# Altium footprint library SAMTEC THD.PcbLib: 161 footprints (part 3 of 12) (continued)
## SAMTEC_MTLW-107-07-L-D-250 [mm] "14 Contacts - Pitch 2.54mm - Dual Row Through Mount Straight Header (Post Lead = 6.35mm, Tail Lead 3.05mm, Insulator 1.52mm)"
height 7.87
pads (14):
  round 1.7 hole 1: 1(-7.62,-1.27) 2(-7.62,1.27) 3(-5.08,-1.27) 4(-5.08,1.27) 5(-2.54,-1.27) 6(-2.54,1.27) 7(0,-1.27) 8(0,1.27) 9(2.54,-1.27) 10(2.54,1.27) 11(5.08,-1.27) 12(5.08,1.27) 13(7.62,-1.27) 14(7.62,1.27)
Top Overlay:
  circle w0.3: c-7.585,-3.135 r0.15
  lines w0.2: 8.89,-2.007 8.636,-2.515 6.604,-2.515 6.35,-2.007 6.096,-2.515 4.064,-2.515 3.81,-2.007 3.556,-2.515 1.524,-2.515 1.27,-2.007 1.016,-2.515 -1.016,-2.515 -1.27,-2.007 -1.524,-2.515 -3.556,-2.515 -3.81,-2.007 -4.064,-2.515 -6.096,-2.515 -6.35,-2.007 -6.604,-2.515 -8.636,-2.515 -8.89,-2.007 -8.89,2.007 -8.636,2.515 -6.604,2.515 -6.35,2.007 -6.096,2.515 -4.064,2.515 -3.81,2.007 -3.556,2.515 -1.524,2.515 -1.27,2.007 -1.016,2.515 1.016,2.515 1.27,2.007 1.524,2.515 3.556,2.515 3.81,2.007 4.064,2.515 6.096,2.515 6.35,2.007 6.604,2.515 8.636,2.515 8.89,2.007 ; 8.89,-2.007 8.89,2.007 ; 8.89,-2.007 8.89,2.007
  text "1" at -9.867,-1.768 h1
Mechanical 8:
  lines w0.1: -8.12,-1.27 -7.62,-1.27 ; -8.12,1.27 -7.62,1.27 ; -7.62,-1.77 -7.62,-1.27 ; -7.62,-0.77 -7.62,-1.27 ; -7.62,0.77 -7.62,1.27 ; -7.62,1.77 -7.62,1.27 ; -7.12,-1.27 -7.62,-1.27 ; -7.12,1.27 -7.62,1.27 ; -5.58,-1.27 -5.08,-1.27 ; -5.58,1.27 -5.08,1.27 ; -5.08,-1.77 -5.08,-1.27 ; -5.08,-0.77 -5.08,-1.27 ; -5.08,0.77 -5.08,1.27 ; -5.08,1.77 -5.08,1.27 ; -4.58,-1.27 -5.08,-1.27 ; -4.58,1.27 -5.08,1.27 ; -3.04,-1.27 -2.54,-1.27 ; -3.04,1.27 -2.54,1.27 ; -2.54,-1.77 -2.54,-1.27 ; -2.54,-0.77 -2.54,-1.27 ; -2.54,0.77 -2.54,1.27 ; -2.54,1.77 -2.54,1.27 ; -2.04,-1.27 -2.54,-1.27 ; -2.04,1.27 -2.54,1.27 ; -0.5,-1.27 0,-1.27 ; -0.5,0 0,0 ; -0.5,1.27 0,1.27 ; 0,-1.77 0,-1.27 ; 0,-0.77 0,-1.27 ; 0,-0.5 0,0 ; 0,0.5 0,0 ; 0,0.77 0,1.27 ; 0,1.77 0,1.27 ; 0.5,-1.27 0,-1.27 ; 0.5,0 0,0 ; 0.5,1.27 0,1.27 ; 2.04,-1.27 2.54,-1.27 ; 2.04,1.27 2.54,1.27 ; 2.54,-1.77 2.54,-1.27 ; 2.54,-0.77 2.54,-1.27 ; 2.54,0.77 2.54,1.27 ; 2.54,1.77 2.54,1.27 ; 3.04,-1.27 2.54,-1.27 ; 3.04,1.27 2.54,1.27 ; 4.58,-1.27 5.08,-1.27 ; 4.58,1.27 5.08,1.27 ; 5.08,-1.77 5.08,-1.27 ; 5.08,-0.77 5.08,-1.27 ; 5.08,0.77 5.08,1.27 ; 5.08,1.77 5.08,1.27 ; 5.58,-1.27 5.08,-1.27 ; 5.58,1.27 5.08,1.27 ; 7.12,-1.27 7.62,-1.27 ; 7.12,1.27 7.62,1.27 ; 7.62,-1.77 7.62,-1.27 ; 7.62,-0.77 7.62,-1.27 ; 7.62,0.77 7.62,1.27 ; 7.62,1.77 7.62,1.27 ; 8.12,-1.27 7.62,-1.27 ; 8.12,1.27 7.62,1.27
Mechanical 14:
  circle w0.3: c-7.585,-3.135 r0.15
  lines w0.1: 8.89,-2.007 8.636,-2.515 6.604,-2.515 6.35,-2.007 6.096,-2.515 4.064,-2.515 3.81,-2.007 3.556,-2.515 1.524,-2.515 1.27,-2.007 1.016,-2.515 -1.016,-2.515 -1.27,-2.007 -1.524,-2.515 -3.556,-2.515 -3.81,-2.007 -4.064,-2.515 -6.096,-2.515 -6.35,-2.007 -6.604,-2.515 -8.636,-2.515 -8.89,-2.007 -8.89,2.007 -8.636,2.515 -6.604,2.515 -6.35,2.007 -6.096,2.515 -4.064,2.515 -3.81,2.007 -3.556,2.515 -1.524,2.515 -1.27,2.007 -1.016,2.515 1.016,2.515 1.27,2.007 1.524,2.515 3.556,2.515 3.81,2.007 4.064,2.515 6.096,2.515 6.35,2.007 6.604,2.515 8.636,2.515 8.89,2.007 ; -7.937,-1.587 -7.937,-0.953 -7.302,-0.953 -7.302,-1.587 -7.937,-1.587 ; -7.937,0.953 -7.937,1.587 -7.302,1.587 -7.302,0.953 -7.937,0.953 ; -5.397,-1.587 -5.397,-0.953 -4.762,-0.953 -4.762,-1.587 -5.397,-1.587 ; -5.397,0.953 -5.397,1.587 -4.762,1.587 -4.762,0.953 -5.397,0.953 ; -2.857,-1.587 -2.857,-0.953 -2.222,-0.953 -2.222,-1.587 -2.857,-1.587 ; -2.857,0.953 -2.857,1.587 -2.222,1.587 -2.222,0.953 -2.857,0.953 ; -0.317,-1.587 -0.317,-0.953 0.318,-0.953 0.318,-1.587 -0.317,-1.587 ; -0.317,0.953 -0.317,1.587 0.318,1.587 0.318,0.953 -0.317,0.953 ; 2.223,-1.587 2.223,-0.953 2.858,-0.953 2.858,-1.587 2.223,-1.587 ; 2.223,0.953 2.223,1.587 2.858,1.587 2.858,0.953 2.223,0.953 ; 4.763,-1.587 4.763,-0.953 5.398,-0.953 5.398,-1.587 4.763,-1.587 ; 4.763,0.953 4.763,1.587 5.398,1.587 5.398,0.953 4.763,0.953 ; 7.303,-1.587 7.303,-0.953 7.938,-0.953 7.938,-1.587 7.303,-1.587 ; 7.303,0.953 7.303,1.587 7.938,1.587 7.938,0.953 7.303,0.953
  text "1" at -9.867,-1.768 h1
3D body "SAMTEC_MTLW-107-07-L-D-250.stp": height 7.87, standoff -3.05, extent -8.89,-2.514 8.89,2.515

## SAMTEC_MTLW-108-07-L-D-250 [mm] "16 Contacts - Pitch 2.54mm - Dual Row Through Mount Straight Header (Post Lead = 6.35mm, Tail Lead 3.05mm, Insulator 1.52mm)"
height 7.87
pads (16):
  round 1.7 hole 1: 1(-8.89,-1.27) 2(-8.89,1.27) 3(-6.35,-1.27) 4(-6.35,1.27) 5(-3.81,-1.27) 6(-3.81,1.27) 7(-1.27,-1.27) 8(-1.27,1.27) 9(1.27,-1.27) 10(1.27,1.27) 11(3.81,-1.27) 12(3.81,1.27) 13(6.35,-1.27) 14(6.35,1.27) 15(8.89,-1.27) 16(8.89,1.27)
Top Overlay:
  circle w0.3: c-8.855,-3.135 r0.15
  lines w0.2: -10.16,-2.007 -9.906,-2.515 -7.874,-2.515 -7.62,-2.007 -7.366,-2.515 -5.334,-2.515 -5.08,-2.007 -4.826,-2.515 -2.794,-2.515 -2.54,-2.007 -2.286,-2.515 -0.254,-2.515 0,-2.007 0.254,-2.515 2.286,-2.515 2.54,-2.007 2.794,-2.515 4.826,-2.515 5.08,-2.007 5.334,-2.515 7.366,-2.515 7.62,-2.007 7.874,-2.515 9.906,-2.515 10.16,-2.007 10.16,2.007 9.906,2.515 7.874,2.515 7.62,2.007 7.366,2.515 5.334,2.515 5.08,2.007 4.826,2.515 2.794,2.515 2.54,2.007 2.286,2.515 0.254,2.515 0,2.007 -0.254,2.515 -2.286,2.515 -2.54,2.007 -2.794,2.515 -4.826,2.515 -5.08,2.007 -5.334,2.515 -7.366,2.515 -7.62,2.007 -7.874,2.515 -9.906,2.515 -10.16,2.007 -10.16,-2.007
  text "1" at -11.137,-1.768 h1
Mechanical 8:
  lines w0.1: -9.39,-1.27 -8.89,-1.27 ; -9.39,1.27 -8.89,1.27 ; -8.89,-1.77 -8.89,-1.27 ; -8.89,-0.77 -8.89,-1.27 ; -8.89,0.77 -8.89,1.27 ; -8.89,1.77 -8.89,1.27 ; -8.39,-1.27 -8.89,-1.27 ; -8.39,1.27 -8.89,1.27 ; -6.85,-1.27 -6.35,-1.27 ; -6.85,1.27 -6.35,1.27 ; -6.35,-1.77 -6.35,-1.27 ; -6.35,-0.77 -6.35,-1.27 ; -6.35,0.77 -6.35,1.27 ; -6.35,1.77 -6.35,1.27 ; -5.85,-1.27 -6.35,-1.27 ; -5.85,1.27 -6.35,1.27 ; -4.31,-1.27 -3.81,-1.27 ; -4.31,1.27 -3.81,1.27 ; -3.81,-1.77 -3.81,-1.27 ; -3.81,-0.77 -3.81,-1.27 ; -3.81,0.77 -3.81,1.27 ; -3.81,1.77 -3.81,1.27 ; -3.31,-1.27 -3.81,-1.27 ; -3.31,1.27 -3.81,1.27 ; -1.77,-1.27 -1.27,-1.27 ; -1.77,1.27 -1.27,1.27 ; -1.27,-1.77 -1.27,-1.27 ; -1.27,-0.77 -1.27,-1.27 ; -1.27,0.77 -1.27,1.27 ; -1.27,1.77 -1.27,1.27 ; -0.77,-1.27 -1.27,-1.27 ; -0.77,1.27 -1.27,1.27 ; -0.5,0 0,0 ; 0,-0.5 0,0 ; 0,0.5 0,0 ; 0.5,0 0,0 ; 0.77,-1.27 1.27,-1.27 ; 0.77,1.27 1.27,1.27 ; 1.27,-1.77 1.27,-1.27 ; 1.27,-0.77 1.27,-1.27 ; 1.27,0.77 1.27,1.27 ; 1.27,1.77 1.27,1.27 ; 1.77,-1.27 1.27,-1.27 ; 1.77,1.27 1.27,1.27 ; 3.31,-1.27 3.81,-1.27 ; 3.31,1.27 3.81,1.27 ; 3.81,-1.77 3.81,-1.27 ; 3.81,-0.77 3.81,-1.27 ; 3.81,0.77 3.81,1.27 ; 3.81,1.77 3.81,1.27 ; 4.31,-1.27 3.81,-1.27 ; 4.31,1.27 3.81,1.27 ; 5.85,-1.27 6.35,-1.27 ; 5.85,1.27 6.35,1.27 ; 6.35,-1.77 6.35,-1.27 ; 6.35,-0.77 6.35,-1.27 ; 6.35,0.77 6.35,1.27 ; 6.35,1.77 6.35,1.27 ; 6.85,-1.27 6.35,-1.27 ; 6.85,1.27 6.35,1.27 ; 8.39,-1.27 8.89,-1.27 ; 8.39,1.27 8.89,1.27 ; 8.89,-1.77 8.89,-1.27 ; 8.89,-0.77 8.89,-1.27 ; 8.89,0.77 8.89,1.27 ; 8.89,1.77 8.89,1.27 ; 9.39,-1.27 8.89,-1.27 ; 9.39,1.27 8.89,1.27
Mechanical 14:
  circle w0.3: c-8.855,-3.135 r0.15
  lines w0.1: -10.16,-2.007 -9.906,-2.515 -7.874,-2.515 -7.62,-2.007 -7.366,-2.515 -5.334,-2.515 -5.08,-2.007 -4.826,-2.515 -2.794,-2.515 -2.54,-2.007 -2.286,-2.515 -0.254,-2.515 0,-2.007 0.254,-2.515 2.286,-2.515 2.54,-2.007 2.794,-2.515 4.826,-2.515 5.08,-2.007 5.334,-2.515 7.366,-2.515 7.62,-2.007 7.874,-2.515 9.906,-2.515 10.16,-2.007 10.16,2.007 9.906,2.515 7.874,2.515 7.62,2.007 7.366,2.515 5.334,2.515 5.08,2.007 4.826,2.515 2.794,2.515 2.54,2.007 2.286,2.515 0.254,2.515 0,2.007 -0.254,2.515 -2.286,2.515 -2.54,2.007 -2.794,2.515 -4.826,2.515 -5.08,2.007 -5.334,2.515 -7.366,2.515 -7.62,2.007 -7.874,2.515 -9.906,2.515 -10.16,2.007 -10.16,-2.007 ; -9.207,-1.587 -8.572,-1.587 -8.572,-0.953 -9.207,-0.953 -9.207,-1.587 ; -9.207,0.953 -8.572,0.953 -8.572,1.587 -9.207,1.587 -9.207,0.953 ; -6.667,-1.587 -6.032,-1.587 -6.032,-0.953 -6.667,-0.953 -6.667,-1.587 ; -6.667,0.953 -6.032,0.953 -6.032,1.587 -6.667,1.587 -6.667,0.953 ; -4.127,-1.587 -3.492,-1.587 -3.492,-0.953 -4.127,-0.953 -4.127,-1.587 ; -4.127,0.953 -3.492,0.953 -3.492,1.587 -4.127,1.587 -4.127,0.953 ; -1.587,-1.587 -0.952,-1.587 -0.952,-0.953 -1.587,-0.953 -1.587,-1.587 ; -1.587,0.953 -0.952,0.953 -0.952,1.587 -1.587,1.587 -1.587,0.953 ; 0.953,-1.587 1.588,-1.587 1.588,-0.953 0.953,-0.953 0.953,-1.587 ; 0.953,0.953 1.588,0.953 1.588,1.587 0.953,1.587 0.953,0.953 ; 3.493,-1.587 4.128,-1.587 4.128,-0.953 3.493,-0.953 3.493,-1.587 ; 3.493,0.953 4.128,0.953 4.128,1.587 3.493,1.587 3.493,0.953 ; 6.033,-1.587 6.668,-1.587 6.668,-0.953 6.033,-0.953 6.033,-1.587 ; 6.033,0.953 6.668,0.953 6.668,1.587 6.033,1.587 6.033,0.953 ; 8.573,-1.587 9.208,-1.587 9.208,-0.953 8.573,-0.953 8.573,-1.587 ; 8.573,0.953 9.208,0.953 9.208,1.587 8.573,1.587 8.573,0.953
  text "1" at -11.137,-1.768 h1
3D body "SAMTEC_MTLW-108-07-L-D-250.stp": height 7.87, standoff -3.05, extent -10.16,-2.514 10.16,2.515

## SAMTEC_MTLW-110-07-L-D-250 [mm] "20 Contacts - Pitch 2.54mm - Dual Row Through Mount Straight Header (Post Lead = 6.35mm, Tail Lead 3.05mm, Insulator 1.52mm)"
height 7.87
pads (20):
  round 1.7 hole 1: 1(-11.43,-1.27) 2(-11.43,1.27) 3(-8.89,-1.27) 4(-8.89,1.27) 5(-6.35,-1.27) 6(-6.35,1.27) 7(-3.81,-1.27) 8(-3.81,1.27) 9(-1.27,-1.27) 10(-1.27,1.27) 11(1.27,-1.27) 12(1.27,1.27) 13(3.81,-1.27) 14(3.81,1.27) 15(6.35,-1.27) 16(6.35,1.27) 17(8.89,-1.27) 18(8.89,1.27) 19(11.43,-1.27) 20(11.43,1.27)
Top Overlay:
  circle w0.3: c-11.395,-3.135 r0.15
  lines w0.2: -12.7,-2.007 -12.7,2.007 -12.446,2.515 -10.414,2.515 -10.16,2.007 -9.906,2.515 -7.874,2.515 -7.62,2.007 -7.366,2.515 -5.334,2.515 -5.08,2.007 -4.826,2.515 -2.794,2.515 -2.54,2.007 -2.286,2.515 -0.254,2.515 0,2.007 0.254,2.515 2.286,2.515 2.54,2.007 2.794,2.515 4.826,2.515 5.08,2.007 5.334,2.515 7.366,2.515 7.62,2.007 7.874,2.515 9.906,2.515 10.16,2.007 10.414,2.515 12.446,2.515 12.7,2.007 12.7,-2.007 12.446,-2.515 10.414,-2.515 10.16,-2.007 9.906,-2.515 7.874,-2.515 7.62,-2.007 7.366,-2.515 5.334,-2.515 5.08,-2.007 4.826,-2.515 2.794,-2.515 2.54,-2.007 2.286,-2.515 0.254,-2.515 0,-2.007 -0.254,-2.515 -2.286,-2.515 -2.54,-2.007 -2.794,-2.515 -4.826,-2.515 -5.08,-2.007 -5.334,-2.515 -7.366,-2.515 -7.62,-2.007 -7.874,-2.515 -9.906,-2.515 -10.16,-2.007 -10.414,-2.515 -12.446,-2.515 -12.7,-2.007
  text "1" at -13.677,-1.768 h1
Mechanical 8:
  lines w0.1: -11.93,-1.27 -11.43,-1.27 ; -11.93,1.27 -11.43,1.27 ; -11.43,-1.77 -11.43,-1.27 ; -11.43,-0.77 -11.43,-1.27 ; -11.43,0.77 -11.43,1.27 ; -11.43,1.77 -11.43,1.27 ; -10.93,-1.27 -11.43,-1.27 ; -10.93,1.27 -11.43,1.27 ; -9.39,-1.27 -8.89,-1.27 ; -9.39,1.27 -8.89,1.27 ; -8.89,-1.77 -8.89,-1.27 ; -8.89,-0.77 -8.89,-1.27 ; -8.89,0.77 -8.89,1.27 ; -8.89,1.77 -8.89,1.27 ; -8.39,-1.27 -8.89,-1.27 ; -8.39,1.27 -8.89,1.27 ; -6.85,-1.27 -6.35,-1.27 ; -6.85,1.27 -6.35,1.27 ; -6.35,-1.77 -6.35,-1.27 ; -6.35,-0.77 -6.35,-1.27 ; -6.35,0.77 -6.35,1.27 ; -6.35,1.77 -6.35,1.27 ; -5.85,-1.27 -6.35,-1.27 ; -5.85,1.27 -6.35,1.27 ; -4.31,-1.27 -3.81,-1.27 ; -4.31,1.27 -3.81,1.27 ; -3.81,-1.77 -3.81,-1.27 ; -3.81,-0.77 -3.81,-1.27 ; -3.81,0.77 -3.81,1.27 ; -3.81,1.77 -3.81,1.27 ; -3.31,-1.27 -3.81,-1.27 ; -3.31,1.27 -3.81,1.27 ; -1.77,-1.27 -1.27,-1.27 ; -1.77,1.27 -1.27,1.27 ; -1.27,-1.77 -1.27,-1.27 ; -1.27,-0.77 -1.27,-1.27 ; -1.27,0.77 -1.27,1.27 ; -1.27,1.77 -1.27,1.27 ; -0.77,-1.27 -1.27,-1.27 ; -0.77,1.27 -1.27,1.27 ; -0.5,0 0,0 ; 0,-0.5 0,0 ; 0,0.5 0,0 ; 0.5,0 0,0 ; 0.77,-1.27 1.27,-1.27 ; 0.77,1.27 1.27,1.27 ; 1.27,-1.77 1.27,-1.27 ; 1.27,-0.77 1.27,-1.27 ; 1.27,0.77 1.27,1.27 ; 1.27,1.77 1.27,1.27 ; 1.77,-1.27 1.27,-1.27 ; 1.77,1.27 1.27,1.27 ; 3.31,-1.27 3.81,-1.27 ; 3.31,1.27 3.81,1.27 ; 3.81,-1.77 3.81,-1.27 ; 3.81,-0.77 3.81,-1.27 ; 3.81,0.77 3.81,1.27 ; 3.81,1.77 3.81,1.27 ; 4.31,-1.27 3.81,-1.27 ; 4.31,1.27 3.81,1.27 ; 5.85,-1.27 6.35,-1.27 ; 5.85,1.27 6.35,1.27 ; 6.35,-1.77 6.35,-1.27 ; 6.35,-0.77 6.35,-1.27 ; 6.35,0.77 6.35,1.27 ; 6.35,1.77 6.35,1.27 ; 6.85,-1.27 6.35,-1.27 ; 6.85,1.27 6.35,1.27 ; 8.39,-1.27 8.89,-1.27 ; 8.39,1.27 8.89,1.27 ; 8.89,-1.77 8.89,-1.27 ; 8.89,-0.77 8.89,-1.27 ; 8.89,0.77 8.89,1.27 ; 8.89,1.77 8.89,1.27 ; 9.39,-1.27 8.89,-1.27 ; 9.39,1.27 8.89,1.27 ; 10.93,-1.27 11.43,-1.27 ; 10.93,1.27 11.43,1.27 ; 11.43,-1.77 11.43,-1.27 ; 11.43,-0.77 11.43,-1.27 ; 11.43,0.77 11.43,1.27 ; 11.43,1.77 11.43,1.27 ; 11.93,-1.27 11.43,-1.27 ; 11.93,1.27 11.43,1.27
Mechanical 14:
  circle w0.3: c-11.395,-3.135 r0.15
  lines w0.1: -12.7,-2.007 -12.7,2.007 -12.446,2.515 -10.414,2.515 -10.16,2.007 -9.906,2.515 -7.874,2.515 -7.62,2.007 -7.366,2.515 -5.334,2.515 -5.08,2.007 -4.826,2.515 -2.794,2.515 -2.54,2.007 -2.286,2.515 -0.254,2.515 0,2.007 0.254,2.515 2.286,2.515 2.54,2.007 2.794,2.515 4.826,2.515 5.08,2.007 5.334,2.515 7.366,2.515 7.62,2.007 7.874,2.515 9.906,2.515 10.16,2.007 10.414,2.515 12.446,2.515 12.7,2.007 12.7,-2.007 12.446,-2.515 10.414,-2.515 10.16,-2.007 9.906,-2.515 7.874,-2.515 7.62,-2.007 7.366,-2.515 5.334,-2.515 5.08,-2.007 4.826,-2.515 2.794,-2.515 2.54,-2.007 2.286,-2.515 0.254,-2.515 0,-2.007 -0.254,-2.515 -2.286,-2.515 -2.54,-2.007 -2.794,-2.515 -4.826,-2.515 -5.08,-2.007 -5.334,-2.515 -7.366,-2.515 -7.62,-2.007 -7.874,-2.515 -9.906,-2.515 -10.16,-2.007 -10.414,-2.515 -12.446,-2.515 -12.7,-2.007 ; -11.748,-1.587 -11.748,-0.953 -11.113,-0.953 -11.113,-1.587 -11.748,-1.587 ; -11.748,0.953 -11.748,1.587 -11.113,1.587 -11.113,0.953 -11.748,0.953 ; -9.208,-1.587 -9.208,-0.953 -8.573,-0.953 -8.573,-1.587 -9.208,-1.587 ; -9.208,0.953 -9.208,1.587 -8.573,1.587 -8.573,0.953 -9.208,0.953 ; -6.668,-1.587 -6.668,-0.953 -6.033,-0.953 -6.033,-1.587 -6.668,-1.587 ; -6.668,0.953 -6.668,1.587 -6.033,1.587 -6.033,0.953 -6.668,0.953 ; -4.128,-1.587 -4.128,-0.953 -3.493,-0.953 -3.493,-1.587 -4.128,-1.587 ; -4.128,0.953 -4.128,1.587 -3.493,1.587 -3.493,0.953 -4.128,0.953 ; -1.587,-1.587 -1.587,-0.953 -0.953,-0.953 -0.953,-1.587 -1.587,-1.587 ; -1.587,0.953 -1.587,1.587 -0.953,1.587 -0.953,0.953 -1.587,0.953 ; 0.953,-1.587 0.953,-0.953 1.587,-0.953 1.587,-1.587 0.953,-1.587 ; 0.953,0.953 0.953,1.587 1.587,1.587 1.587,0.953 0.953,0.953 ; 3.493,-1.587 3.493,-0.953 4.128,-0.953 4.128,-1.587 3.493,-1.587 ; 3.493,0.953 3.493,1.587 4.128,1.587 4.128,0.953 3.493,0.953 ; 6.033,-1.587 6.033,-0.953 6.668,-0.953 6.668,-1.587 6.033,-1.587 ; 6.033,0.953 6.033,1.587 6.668,1.587 6.668,0.953 6.033,0.953 ; 8.573,-1.587 8.573,-0.953 9.208,-0.953 9.208,-1.587 8.573,-1.587 ; 8.573,0.953 8.573,1.587 9.208,1.587 9.208,0.953 8.573,0.953 ; 11.113,-1.587 11.113,-0.953 11.748,-0.953 11.748,-1.587 11.113,-1.587 ; 11.113,0.953 11.113,1.587 11.748,1.587 11.748,0.953 11.113,0.953
  text "1" at -13.677,-1.768 h1
3D body "SAMTEC_MTLW-110-07-L-D-250.stp": height 7.87, standoff -3.05, extent -12.7,-2.514 12.7,2.515

## SAMTEC_MTLW-111-07-L-D-250 [mm] "22 Contacts - Pitch 2.54mm - Dual Row Through Mount Straight Header (Post Lead = 6.35mm, Tail Lead 3.05mm, Insulator 1.52mm)"
height 7.87
pads (22):
  round 1.7 hole 1: 1(-12.7,-1.27) 2(-12.7,1.27) 3(-10.16,-1.27) 4(-10.16,1.27) 5(-7.62,-1.27) 6(-7.62,1.27) 7(-5.08,-1.27) 8(-5.08,1.27) 9(-2.54,-1.27) 10(-2.54,1.27) 11(0,-1.27) 12(0,1.27) 13(2.54,-1.27) 14(2.54,1.27) 15(5.08,-1.27) 16(5.08,1.27) 17(7.62,-1.27) 18(7.62,1.27) 19(10.16,-1.27) 20(10.16,1.27) 21(12.7,-1.27) 22(12.7,1.27)
Top Overlay:
  circle w0.3: c-12.665,-3.135 r0.15
  lines w0.2: -13.97,-2.007 -13.716,-2.515 -11.684,-2.515 -11.43,-2.007 -11.176,-2.515 -9.144,-2.515 -8.89,-2.007 -8.636,-2.515 -6.604,-2.515 -6.35,-2.007 -6.096,-2.515 -4.064,-2.515 -3.81,-2.007 -3.556,-2.515 -1.524,-2.515 -1.27,-2.007 -1.016,-2.515 1.016,-2.515 1.27,-2.007 1.524,-2.515 3.556,-2.515 3.81,-2.007 4.064,-2.515 6.096,-2.515 6.35,-2.007 6.604,-2.515 8.636,-2.515 8.89,-2.007 9.144,-2.515 11.176,-2.515 11.43,-2.007 11.684,-2.515 13.716,-2.515 13.97,-2.007 13.97,2.007 13.716,2.515 11.684,2.515 11.43,2.007 11.176,2.515 9.144,2.515 8.89,2.007 8.636,2.515 6.604,2.515 6.35,2.007 6.096,2.515 4.064,2.515 3.81,2.007 3.556,2.515 1.524,2.515 1.27,2.007 1.016,2.515 -1.016,2.515 -1.27,2.007 -1.524,2.515 -3.556,2.515 -3.81,2.007 -4.064,2.515 -6.096,2.515 -6.35,2.007 -6.604,2.515 -8.636,2.515 -8.89,2.007 -9.144,2.515 -11.176,2.515 -11.43,2.007 -11.684,2.515 -13.716,2.515 -13.97,2.007 -13.97,-2.007
  text "1" at -14.947,-1.768 h1
Mechanical 8:
  lines w0.1: -13.2,-1.27 -12.7,-1.27 ; -13.2,1.27 -12.7,1.27 ; -12.7,-1.77 -12.7,-1.27 ; -12.7,-0.77 -12.7,-1.27 ; -12.7,0.77 -12.7,1.27 ; -12.7,1.77 -12.7,1.27 ; -12.2,-1.27 -12.7,-1.27 ; -12.2,1.27 -12.7,1.27 ; -10.66,-1.27 -10.16,-1.27 ; -10.66,1.27 -10.16,1.27 ; -10.16,-1.77 -10.16,-1.27 ; -10.16,-0.77 -10.16,-1.27 ; -10.16,0.77 -10.16,1.27 ; -10.16,1.77 -10.16,1.27 ; -9.66,-1.27 -10.16,-1.27 ; -9.66,1.27 -10.16,1.27 ; -8.12,-1.27 -7.62,-1.27 ; -8.12,1.27 -7.62,1.27 ; -7.62,-1.77 -7.62,-1.27 ; -7.62,-0.77 -7.62,-1.27 ; -7.62,0.77 -7.62,1.27 ; -7.62,1.77 -7.62,1.27 ; -7.12,-1.27 -7.62,-1.27 ; -7.12,1.27 -7.62,1.27 ; -5.58,-1.27 -5.08,-1.27 ; -5.58,1.27 -5.08,1.27 ; -5.08,-1.77 -5.08,-1.27 ; -5.08,-0.77 -5.08,-1.27 ; -5.08,0.77 -5.08,1.27 ; -5.08,1.77 -5.08,1.27 ; -4.58,-1.27 -5.08,-1.27 ; -4.58,1.27 -5.08,1.27 ; -3.04,-1.27 -2.54,-1.27 ; -3.04,1.27 -2.54,1.27 ; -2.54,-1.77 -2.54,-1.27 ; -2.54,-0.77 -2.54,-1.27 ; -2.54,0.77 -2.54,1.27 ; -2.54,1.77 -2.54,1.27 ; -2.04,-1.27 -2.54,-1.27 ; -2.04,1.27 -2.54,1.27 ; -0.5,-1.27 0,-1.27 ; -0.5,0 0,0 ; -0.5,1.27 0,1.27 ; 0,-1.77 0,-1.27 ; 0,-0.77 0,-1.27 ; 0,-0.5 0,0 ; 0,0.5 0,0 ; 0,0.77 0,1.27 ; 0,1.77 0,1.27 ; 0.5,-1.27 0,-1.27 ; 0.5,0 0,0 ; 0.5,1.27 0,1.27 ; 2.04,-1.27 2.54,-1.27 ; 2.04,1.27 2.54,1.27 ; 2.54,-1.77 2.54,-1.27 ; 2.54,-0.77 2.54,-1.27 ; 2.54,0.77 2.54,1.27 ; 2.54,1.77 2.54,1.27 ; 3.04,-1.27 2.54,-1.27 ; 3.04,1.27 2.54,1.27 ; 4.58,-1.27 5.08,-1.27 ; 4.58,1.27 5.08,1.27 ; 5.08,-1.77 5.08,-1.27 ; 5.08,-0.77 5.08,-1.27 ; 5.08,0.77 5.08,1.27 ; 5.08,1.77 5.08,1.27 ; 5.58,-1.27 5.08,-1.27 ; 5.58,1.27 5.08,1.27 ; 7.12,-1.27 7.62,-1.27 ; 7.12,1.27 7.62,1.27 ; 7.62,-1.77 7.62,-1.27 ; 7.62,-0.77 7.62,-1.27 ; 7.62,0.77 7.62,1.27 ; 7.62,1.77 7.62,1.27 ; 8.12,-1.27 7.62,-1.27 ; 8.12,1.27 7.62,1.27 ; 9.66,-1.27 10.16,-1.27 ; 9.66,1.27 10.16,1.27 ; 10.16,-1.77 10.16,-1.27 ; 10.16,-0.77 10.16,-1.27 ; 10.16,0.77 10.16,1.27 ; 10.16,1.77 10.16,1.27 ; 10.66,-1.27 10.16,-1.27 ; 10.66,1.27 10.16,1.27 ; 12.2,-1.27 12.7,-1.27 ; 12.2,1.27 12.7,1.27 ; 12.7,-1.77 12.7,-1.27 ; 12.7,-0.77 12.7,-1.27 ; 12.7,0.77 12.7,1.27 ; 12.7,1.77 12.7,1.27 ; 13.2,-1.27 12.7,-1.27 ; 13.2,1.27 12.7,1.27
Mechanical 14:
  drawing of 157 lines, arcs and shapes, not listed
  text "1" at -14.947,-1.768 h1
3D body "SAMTEC_MTLW-111-07-L-D-250.stp": height 7.87, standoff -3.05, extent -13.97,-2.514 13.97,2.515

## SAMTEC_MTLW-112-07-L-D-250 [mm] "24 Contacts - Pitch 2.54mm - Dual Row Through Mount Straight Header (Post Lead = 6.35mm, Tail Lead 3.05mm, Insulator 1.52mm)"
height 7.87
pads (24):
  round 1.7 hole 1: 1(-13.97,-1.27) 2(-13.97,1.27) 3(-11.43,-1.27) 4(-11.43,1.27) 5(-8.89,-1.27) 6(-8.89,1.27) 7(-6.35,-1.27) 8(-6.35,1.27) 9(-3.81,-1.27) 10(-3.81,1.27) 11(-1.27,-1.27) 12(-1.27,1.27) 13(1.27,-1.27) 14(1.27,1.27) 15(3.81,-1.27) 16(3.81,1.27) 17(6.35,-1.27) 18(6.35,1.27) 19(8.89,-1.27) 20(8.89,1.27) 21(11.43,-1.27) 22(11.43,1.27) 23(13.97,-1.27) 24(13.97,1.27)
Top Overlay:
  circle w0.3: c-13.935,-3.135 r0.15
  lines w0.2: -15.24,-2.007 -15.24,2.007 -14.986,2.515 -12.954,2.515 -12.7,2.007 -12.446,2.515 -10.414,2.515 -10.16,2.007 -9.906,2.515 -7.874,2.515 -7.62,2.007 -7.366,2.515 -5.334,2.515 -5.08,2.007 -4.826,2.515 -2.794,2.515 -2.54,2.007 -2.286,2.515 -0.254,2.515 0,2.007 0.254,2.515 2.286,2.515 2.54,2.007 2.794,2.515 4.826,2.515 5.08,2.007 5.334,2.515 7.366,2.515 7.62,2.007 7.874,2.515 9.906,2.515 10.16,2.007 10.414,2.515 12.446,2.515 12.7,2.007 12.954,2.515 14.986,2.515 15.24,2.007 15.24,-2.007 14.986,-2.515 12.954,-2.515 12.7,-2.007 12.446,-2.515 10.414,-2.515 10.16,-2.007 9.906,-2.515 7.874,-2.515 7.62,-2.007 7.366,-2.515 5.334,-2.515 5.08,-2.007 4.826,-2.515 2.794,-2.515 2.54,-2.007 2.286,-2.515 0.254,-2.515 0,-2.007 -0.254,-2.515 -2.286,-2.515 -2.54,-2.007 -2.794,-2.515 -4.826,-2.515 -5.08,-2.007 -5.334,-2.515 -7.366,-2.515 -7.62,-2.007 -7.874,-2.515 -9.906,-2.515 -10.16,-2.007 -10.414,-2.515 -12.446,-2.515 -12.7,-2.007 -12.954,-2.515 -14.986,-2.515 -15.24,-2.007
  text "1" at -16.217,-1.768 h1
Mechanical 8:
  lines w0.1: -14.47,-1.27 -13.97,-1.27 ; -14.47,1.27 -13.97,1.27 ; -13.97,-1.77 -13.97,-1.27 ; -13.97,-0.77 -13.97,-1.27 ; -13.97,0.77 -13.97,1.27 ; -13.97,1.77 -13.97,1.27 ; -13.47,-1.27 -13.97,-1.27 ; -13.47,1.27 -13.97,1.27 ; -11.93,-1.27 -11.43,-1.27 ; -11.93,1.27 -11.43,1.27 ; -11.43,-1.77 -11.43,-1.27 ; -11.43,-0.77 -11.43,-1.27 ; -11.43,0.77 -11.43,1.27 ; -11.43,1.77 -11.43,1.27 ; -10.93,-1.27 -11.43,-1.27 ; -10.93,1.27 -11.43,1.27 ; -9.39,-1.27 -8.89,-1.27 ; -9.39,1.27 -8.89,1.27 ; -8.89,-1.77 -8.89,-1.27 ; -8.89,-0.77 -8.89,-1.27 ; -8.89,0.77 -8.89,1.27 ; -8.89,1.77 -8.89,1.27 ; -8.39,-1.27 -8.89,-1.27 ; -8.39,1.27 -8.89,1.27 ; -6.85,-1.27 -6.35,-1.27 ; -6.85,1.27 -6.35,1.27 ; -6.35,-1.77 -6.35,-1.27 ; -6.35,-0.77 -6.35,-1.27 ; -6.35,0.77 -6.35,1.27 ; -6.35,1.77 -6.35,1.27 ; -5.85,-1.27 -6.35,-1.27 ; -5.85,1.27 -6.35,1.27 ; -4.31,-1.27 -3.81,-1.27 ; -4.31,1.27 -3.81,1.27 ; -3.81,-1.77 -3.81,-1.27 ; -3.81,-0.77 -3.81,-1.27 ; -3.81,0.77 -3.81,1.27 ; -3.81,1.77 -3.81,1.27 ; -3.31,-1.27 -3.81,-1.27 ; -3.31,1.27 -3.81,1.27 ; -1.77,-1.27 -1.27,-1.27 ; -1.77,1.27 -1.27,1.27 ; -1.27,-1.77 -1.27,-1.27 ; -1.27,-0.77 -1.27,-1.27 ; -1.27,0.77 -1.27,1.27 ; -1.27,1.77 -1.27,1.27 ; -0.77,-1.27 -1.27,-1.27 ; -0.77,1.27 -1.27,1.27 ; -0.5,0 0,0 ; 0,-0.5 0,0 ; 0,0.5 0,0 ; 0.5,0 0,0 ; 0.77,-1.27 1.27,-1.27 ; 0.77,1.27 1.27,1.27 ; 1.27,-1.77 1.27,-1.27 ; 1.27,-0.77 1.27,-1.27 ; 1.27,0.77 1.27,1.27 ; 1.27,1.77 1.27,1.27 ; 1.77,-1.27 1.27,-1.27 ; 1.77,1.27 1.27,1.27 ; 3.31,-1.27 3.81,-1.27 ; 3.31,1.27 3.81,1.27 ; 3.81,-1.77 3.81,-1.27 ; 3.81,-0.77 3.81,-1.27 ; 3.81,0.77 3.81,1.27 ; 3.81,1.77 3.81,1.27 ; 4.31,-1.27 3.81,-1.27 ; 4.31,1.27 3.81,1.27 ; 5.85,-1.27 6.35,-1.27 ; 5.85,1.27 6.35,1.27 ; 6.35,-1.77 6.35,-1.27 ; 6.35,-0.77 6.35,-1.27 ; 6.35,0.77 6.35,1.27 ; 6.35,1.77 6.35,1.27 ; 6.85,-1.27 6.35,-1.27 ; 6.85,1.27 6.35,1.27 ; 8.39,-1.27 8.89,-1.27 ; 8.39,1.27 8.89,1.27 ; 8.89,-1.77 8.89,-1.27 ; 8.89,-0.77 8.89,-1.27 ; 8.89,0.77 8.89,1.27 ; 8.89,1.77 8.89,1.27 ; 9.39,-1.27 8.89,-1.27 ; 9.39,1.27 8.89,1.27 ; 10.93,-1.27 11.43,-1.27 ; 10.93,1.27 11.43,1.27 ; 11.43,-1.77 11.43,-1.27 ; 11.43,-0.77 11.43,-1.27 ; 11.43,0.77 11.43,1.27 ; 11.43,1.77 11.43,1.27 ; 11.93,-1.27 11.43,-1.27 ; 11.93,1.27 11.43,1.27 ; 13.47,-1.27 13.97,-1.27 ; 13.47,1.27 13.97,1.27 ; 13.97,-1.77 13.97,-1.27 ; 13.97,-0.77 13.97,-1.27 ; 13.97,0.77 13.97,1.27 ; 13.97,1.77 13.97,1.27 ; 14.47,-1.27 13.97,-1.27 ; 14.47,1.27 13.97,1.27
Mechanical 14:
  drawing of 171 lines, arcs and shapes, not listed
  text "1" at -16.217,-1.768 h1
3D body "SAMTEC_MTLW-112-07-L-D-250.stp": height 7.87, standoff -3.05, extent -15.24,-2.514 15.24,2.515

## SAMTEC_MTLW-113-07-L-D-250 [mm] "26 Contacts - Pitch 2.54mm - Dual Row Through Mount Straight Header (Post Lead = 6.35mm, Tail Lead 3.05mm, Insulator 1.52mm)"
height 7.87
pads (26):
  round 1.7 hole 1: 1(-15.24,-1.27) 2(-15.24,1.27) 3(-12.7,-1.27) 4(-12.7,1.27) 5(-10.16,-1.27) 6(-10.16,1.27) 7(-7.62,-1.27) 8(-7.62,1.27) 9(-5.08,-1.27) 10(-5.08,1.27) 11(-2.54,-1.27) 12(-2.54,1.27) 13(0,-1.27) 14(0,1.27) 15(2.54,-1.27) 16(2.54,1.27) 17(5.08,-1.27) 18(5.08,1.27) 19(7.62,-1.27) 20(7.62,1.27) 21(10.16,-1.27) 22(10.16,1.27) 23(12.7,-1.27) 24(12.7,1.27) 25(15.24,-1.27) 26(15.24,1.27)
Top Overlay:
  circle w0.3: c-15.205,-3.135 r0.15
  lines w0.2: -16.51,-2.007 -16.51,2.007 -16.256,2.515 -14.224,2.515 -13.97,2.007 -13.716,2.515 -11.684,2.515 -11.43,2.007 -11.176,2.515 -9.144,2.515 -8.89,2.007 -8.636,2.515 -6.604,2.515 -6.35,2.007 -6.096,2.515 -4.064,2.515 -3.81,2.007 -3.556,2.515 -1.524,2.515 -1.27,2.007 -1.016,2.515 1.016,2.515 1.27,2.007 1.524,2.515 3.556,2.515 3.81,2.007 4.064,2.515 6.096,2.515 6.35,2.007 6.604,2.515 8.636,2.515 8.89,2.007 9.144,2.515 11.176,2.515 11.43,2.007 11.684,2.515 13.716,2.515 13.97,2.007 14.224,2.515 16.256,2.515 16.51,2.007 16.51,-2.007 16.256,-2.515 14.224,-2.515 13.97,-2.007 13.716,-2.515 11.684,-2.515 11.43,-2.007 11.176,-2.515 9.144,-2.515 8.89,-2.007 8.636,-2.515 6.604,-2.515 6.35,-2.007 6.096,-2.515 4.064,-2.515 3.81,-2.007 3.556,-2.515 1.524,-2.515 1.27,-2.007 1.016,-2.515 -1.016,-2.515 -1.27,-2.007 -1.524,-2.515 -3.556,-2.515 -3.81,-2.007 -4.064,-2.515 -6.096,-2.515 -6.35,-2.007 -6.604,-2.515 -8.636,-2.515 -8.89,-2.007 -9.144,-2.515 -11.176,-2.515 -11.43,-2.007 -11.684,-2.515 -13.716,-2.515 -13.97,-2.007 -14.224,-2.515 -16.256,-2.515 -16.51,-2.007
  text "1" at -17.487,-1.768 h1
Mechanical 8:
  lines w0.1: -15.74,-1.27 -15.24,-1.27 ; -15.74,1.27 -15.24,1.27 ; -15.24,-1.77 -15.24,-1.27 ; -15.24,-0.77 -15.24,-1.27 ; -15.24,0.77 -15.24,1.27 ; -15.24,1.77 -15.24,1.27 ; -14.74,-1.27 -15.24,-1.27 ; -14.74,1.27 -15.24,1.27 ; -13.2,-1.27 -12.7,-1.27 ; -13.2,1.27 -12.7,1.27 ; -12.7,-1.77 -12.7,-1.27 ; -12.7,-0.77 -12.7,-1.27 ; -12.7,0.77 -12.7,1.27 ; -12.7,1.77 -12.7,1.27 ; -12.2,-1.27 -12.7,-1.27 ; -12.2,1.27 -12.7,1.27 ; -10.66,-1.27 -10.16,-1.27 ; -10.66,1.27 -10.16,1.27 ; -10.16,-1.77 -10.16,-1.27 ; -10.16,-0.77 -10.16,-1.27 ; -10.16,0.77 -10.16,1.27 ; -10.16,1.77 -10.16,1.27 ; -9.66,-1.27 -10.16,-1.27 ; -9.66,1.27 -10.16,1.27 ; -8.12,-1.27 -7.62,-1.27 ; -8.12,1.27 -7.62,1.27 ; -7.62,-1.77 -7.62,-1.27 ; -7.62,-0.77 -7.62,-1.27 ; -7.62,0.77 -7.62,1.27 ; -7.62,1.77 -7.62,1.27 ; -7.12,-1.27 -7.62,-1.27 ; -7.12,1.27 -7.62,1.27 ; -5.58,-1.27 -5.08,-1.27 ; -5.58,1.27 -5.08,1.27 ; -5.08,-1.77 -5.08,-1.27 ; -5.08,-0.77 -5.08,-1.27 ; -5.08,0.77 -5.08,1.27 ; -5.08,1.77 -5.08,1.27 ; -4.58,-1.27 -5.08,-1.27 ; -4.58,1.27 -5.08,1.27 ; -3.04,-1.27 -2.54,-1.27 ; -3.04,1.27 -2.54,1.27 ; -2.54,-1.77 -2.54,-1.27 ; -2.54,-0.77 -2.54,-1.27 ; -2.54,0.77 -2.54,1.27 ; -2.54,1.77 -2.54,1.27 ; -2.04,-1.27 -2.54,-1.27 ; -2.04,1.27 -2.54,1.27 ; -0.5,-1.27 0,-1.27 ; -0.5,0 0,0 ; -0.5,1.27 0,1.27 ; 0,-1.77 0,-1.27 ; 0,-0.77 0,-1.27 ; 0,-0.5 0,0 ; 0,0.5 0,0 ; 0,0.77 0,1.27 ; 0,1.77 0,1.27 ; 0.5,-1.27 0,-1.27 ; 0.5,0 0,0 ; 0.5,1.27 0,1.27 ; 2.04,-1.27 2.54,-1.27 ; 2.04,1.27 2.54,1.27 ; 2.54,-1.77 2.54,-1.27 ; 2.54,-0.77 2.54,-1.27 ; 2.54,0.77 2.54,1.27 ; 2.54,1.77 2.54,1.27 ; 3.04,-1.27 2.54,-1.27 ; 3.04,1.27 2.54,1.27 ; 4.58,-1.27 5.08,-1.27 ; 4.58,1.27 5.08,1.27 ; 5.08,-1.77 5.08,-1.27 ; 5.08,-0.77 5.08,-1.27 ; 5.08,0.77 5.08,1.27 ; 5.08,1.77 5.08,1.27 ; 5.58,-1.27 5.08,-1.27 ; 5.58,1.27 5.08,1.27 ; 7.12,-1.27 7.62,-1.27 ; 7.12,1.27 7.62,1.27 ; 7.62,-1.77 7.62,-1.27 ; 7.62,-0.77 7.62,-1.27 ; 7.62,0.77 7.62,1.27 ; 7.62,1.77 7.62,1.27 ; 8.12,-1.27 7.62,-1.27 ; 8.12,1.27 7.62,1.27 ; 9.66,-1.27 10.16,-1.27 ; 9.66,1.27 10.16,1.27 ; 10.16,-1.77 10.16,-1.27 ; 10.16,-0.77 10.16,-1.27 ; 10.16,0.77 10.16,1.27 ; 10.16,1.77 10.16,1.27 ; 10.66,-1.27 10.16,-1.27 ; 10.66,1.27 10.16,1.27 ; 12.2,-1.27 12.7,-1.27 ; 12.2,1.27 12.7,1.27 ; 12.7,-1.77 12.7,-1.27 ; 12.7,-0.77 12.7,-1.27 ; 12.7,0.77 12.7,1.27 ; 12.7,1.77 12.7,1.27 ; 13.2,-1.27 12.7,-1.27 ; 13.2,1.27 12.7,1.27 ; 14.74,-1.27 15.24,-1.27 ; 14.74,1.27 15.24,1.27 ; 15.24,-1.77 15.24,-1.27 ; 15.24,-0.77 15.24,-1.27 ; 15.24,0.77 15.24,1.27 ; 15.24,1.77 15.24,1.27 ; 15.74,-1.27 15.24,-1.27 ; 15.74,1.27 15.24,1.27
Mechanical 14:
  drawing of 185 lines, arcs and shapes, not listed
  text "1" at -17.487,-1.768 h1
3D body "SAMTEC_MTLW-113-07-L-D-250.stp": height 7.87, standoff -3.05, extent -16.51,-2.514 16.51,2.515